# Altium integrated library WE-CMBNC Common Mode Power Line Choke.IntLib: 36 symbols
Pins are listed as number, name and electrical type; pins without a type are passive.

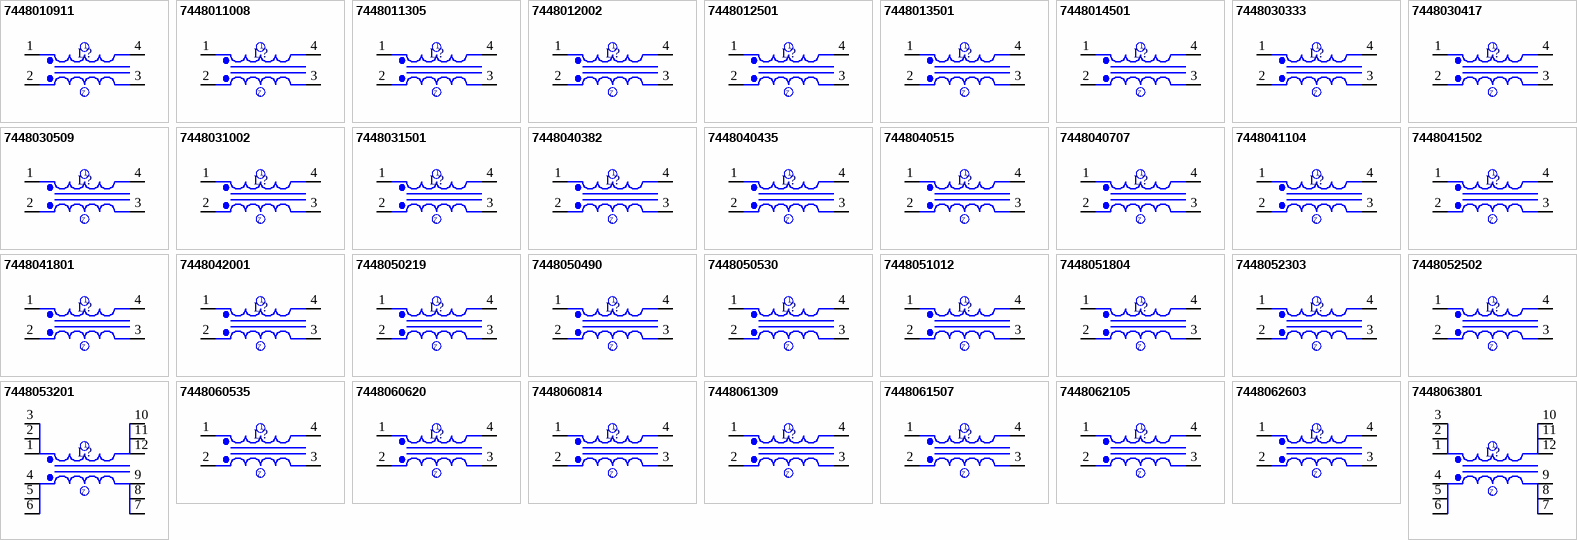
[diagram p0: symbols 7448010911 to 7448063801]

## 7448010911
designator L?
THT Common Mode Power Line  Choke, WE-CMBNC , L=2x11mH; PartNumber: 7448010911; Inductance: 2x11mH; PackageReference: Type XS-7448010911; ComponentLink1Description: Manufacturer URL; ComponentLink1URL: http://www.we-online.com; ComponentLink2Description: Datasheet; ComponentLink2URL: http://katalog.we-online.de/pbs/datasheet/7448042001.pdfhttp://katalog.we-online.de/pbs/datasheet/7448042001.pdfhttp://katalog.we-online.de/pbs/datasheet/7448042001.pdfhttp://katalog.we-online.de/pbs/datasheet/7448010911.pdf
footprint Type XS-7448010911 (THT-4pin- Body 14x7.5mm)
pins: 1, 2, 3, 4

## 7448011008
designator L?
THT Common Mode Power Line  Choke, WE-CMBNC , L=2x8mH; PartNumber: 7448011008; Inductance: 2x8mH; PackageReference: Type XS-7448011008; ComponentLink1Description: Manufacturer URL; ComponentLink1URL: http://www.we-online.com; ComponentLink2Description: Datasheet; ComponentLink2URL: http://katalog.we-online.de/pbs/datasheet/7448042001.pdfhttp://katalog.we-online.de/pbs/datasheet/7448042001.pdfhttp://katalog.we-online.de/pbs/datasheet/7448042001.pdfhttp://katalog.we-online.de/pbs/datasheet/7448011008.pdf
footprint Type XS-7448011008 (THT-4pin- Body 14x7.5mm)
pins: 1, 2, 3, 4

## 7448011305
designator L?
THT Common Mode Power Line  Choke, WE-CMBNC , L=2x5mH; PartNumber: 7448011305; Inductance: 2x5mH; PackageReference: Type XS-7448011305; ComponentLink1Description: Manufacturer URL; ComponentLink1URL: http://www.we-online.com; ComponentLink2Description: Datasheet; ComponentLink2URL: http://katalog.we-online.de/pbs/datasheet/7448042001.pdfhttp://katalog.we-online.de/pbs/datasheet/7448042001.pdfhttp://katalog.we-online.de/pbs/datasheet/7448042001.pdfhttp://katalog.we-online.de/pbs/datasheet/7448011305.pdf
footprint Type XS-7448011305 (THT-4pin- Body 14x7.5mm)
pins: 1, 2, 3, 4

## 7448012002
designator L?
THT Common Mode Power Line  Choke WE-CMBNC , L=2x1.6mH; PartNumber: 7448012002; PackageReference: Type XS-7448012002; Inductance: 2x1.6mH; ComponentLink1Description: Manufacturer URL; ComponentLink1URL: http://www.we-online.com; ComponentLink2Description: Datasheet; ComponentLink2URL: http://katalog.we-online.de/pbs/datasheet/7448042001.pdfhttp://katalog.we-online.de/pbs/datasheet/7448042001.pdfhttp://katalog.we-online.de/pbs/datasheet/7448042001.pdfhttp://katalog.we-online.de/pbs/datasheet/7448012002.pdf
footprint Type XS-7448012002 (THT-4pin- Body 14x7.5mm)
pins: 1, 2, 3, 4

## 7448012501
designator L?
THT Common Mode Power Line  Choke WE-CMBNC , L=2x1mH; PartNumber: 7448012501; Inductance: 2x1mH; PackageReference: Type XS-7448012501; ComponentLink1Description: Manufacturer URL; ComponentLink1URL: http://www.we-online.com; ComponentLink2Description: Datasheet; ComponentLink2URL: http://katalog.we-online.de/pbs/datasheet/7448042001.pdfhttp://katalog.we-online.de/pbs/datasheet/7448042001.pdfhttp://katalog.we-online.de/pbs/datasheet/7448042001.pdfhttp://katalog.we-online.de/pbs/datasheet/7448012501.pdf
footprint Type XS-7448012501 (THT-4pin- Body 15x7.5mm)
pins: 1, 2, 3, 4

## 7448013501
designator L?
THT Common Mode Power Line  Choke , WE-CMBNC, L=2x0.5mH; PartNumber: 7448013501; PackageReference: Type XS-7448013501; Inductance: 2x0.5 mH; ComponentLink1Description: Manufacturer URL; ComponentLink1URL: http://www.we-online.com; ComponentLink2Description: Datasheet; ComponentLink2URL: http://katalog.we-online.de/pbs/datasheet/7448042001.pdfhttp://katalog.we-online.de/pbs/datasheet/7448042001.pdfhttp://katalog.we-online.de/pbs/datasheet/7448042001.pdfhttp://katalog.we-online.de/pbs/datasheet/7448013501.pdf
footprint Type XS-7448013501 (THT-4pin- Body 15x7.5mm)
pins: 1, 2, 3, 4

## 7448014501
designator L?
THT Common Mode Power Line  Choke WE-CMBNC , L=2x0.4mH; PartNumber: 7448014501; PackageReference: Type XS-7448014501; Inductance: 2x0.4 mH; ComponentLink1Description: Manufacturer URL; ComponentLink1URL: http://www.we-online.com; ComponentLink2Description: Datasheet; ComponentLink2URL: http://katalog.we-online.de/pbs/datasheet/7448042001.pdfhttp://katalog.we-online.de/pbs/datasheet/7448042001.pdfhttp://katalog.we-online.de/pbs/datasheet/7448042001.pdfhttp://katalog.we-online.de/pbs/datasheet/7448014501.pdf
footprint Type XS-7448014501 (THT-3pin- Body 14x7.5mm)
pins: 1, 2, 3, 4

## 7448030333
designator L?
THT Common Mode Power Line  Choke WE-CMBNC , L=2x33mH; PartNumber: 7448030333; Inductance: 2x33mH; PackageReference: TYPE M-7448030333; ComponentLink1Description: Manufacturer URL; ComponentLink1URL: http://www.we-online.com; ComponentLink2Description: Datasheet; ComponentLink2URL: http://katalog.we-online.de/pbs/datasheet/7448042001.pdfhttp://katalog.we-online.de/pbs/datasheet/7448042001.pdfhttp://katalog.we-online.de/pbs/datasheet/7448042001.pdfhttp://katalog.we-online.de/pbs/datasheet/7448030333.pdf
footprint TYPE M-7448030333 (THT-4pin- Body 22x13.5mm)
pins: 1, 2, 3, 4

## 7448030417
designator L?
THT Common Mode Power Line  Choke WE-CMBNC , L=2x17mH; PartNumber: 7448030417; Inductance: 2x17mH; PackageReference: TYPE M-7448030509; ComponentLink1Description: Manufacturer URL; ComponentLink1URL: http://www.we-online.com; ComponentLink2Description: Datasheet; ComponentLink2URL: http://katalog.we-online.de/pbs/datasheet/7448042001.pdfhttp://katalog.we-online.de/pbs/datasheet/7448042001.pdfhttp://katalog.we-online.de/pbs/datasheet/7448042001.pdfhttp://katalog.we-online.de/pbs/datasheet/7448030417.pdf
footprint TYPE M-7448030509 (THT-4pin- Body 22x13.5mm)
pins: 1, 2, 3, 4

## 7448030509
designator L?
THT Common Mode Power Line  Choke WE-CMBNC , L=2x9mH; PartNumber: 7448030509; Inductance: 2x9mH; PackageReference: TYPE M-7448030509; ComponentLink1Description: Manufacturer URL; ComponentLink1URL: http://www.we-online.com; ComponentLink2Description: Datasheet; ComponentLink2URL: http://katalog.we-online.de/pbs/datasheet/7448042001.pdfhttp://katalog.we-online.de/pbs/datasheet/7448042001.pdfhttp://katalog.we-online.de/pbs/datasheet/7448042001.pdfhttp://katalog.we-online.de/pbs/datasheet/7448030509.pdf
footprint TYPE M-7448030509 (THT-4pin- Body 22x13.5mm)
pins: 1, 2, 3, 4

## 7448031002
designator L?
THT Common Mode Power Line  Choke WE-CMBNC , L=2x2mH; PartNumber: 7448031002; Inductance: 2x2mH; PackageReference: Type M-7448031002; ComponentLink1Description: Manufacturer URL; ComponentLink1URL: http://www.we-online.com; ComponentLink2Description: Datasheet; ComponentLink2URL: http://katalog.we-online.de/pbs/datasheet/7448042001.pdfhttp://katalog.we-online.de/pbs/datasheet/7448042001.pdfhttp://katalog.we-online.de/pbs/datasheet/7448042001.pdfhttp://katalog.we-online.de/pbs/datasheet/7448031002.pdf
footprint Type M-7448031002 (THT-4pin- Body 23x17mm)
pins: 1, 2, 3, 4

## 7448031501
designator L?
THT Common Mode Power Line  Choke WE-CMBNC , L=2x1mH; PartNumber: 7448031501; Inductance: 2x1mH; PackageReference: Type M-7448031501; ComponentLink1Description: Manufacturer URL; ComponentLink1URL: http://www.we-online.com; ComponentLink2Description: Datasheet; ComponentLink2URL: http://katalog.we-online.de/pbs/datasheet/7448042001.pdfhttp://katalog.we-online.de/pbs/datasheet/7448042001.pdfhttp://katalog.we-online.de/pbs/datasheet/7448042001.pdfhttp://katalog.we-online.de/pbs/datasheet/7448031501.pdf
footprint Type M-7448031501 (THT-4pin- Body 23x17mm)
pins: 1, 2, 3, 4

## 7448040382
designator L?
THT Common Mode Power Line  Choke WE-CMBNC , L=2x82mH; PartNumber: 7448040382; Inductance: 2x82mH; PackageReference: TYPE L-7448040382; ComponentLink1Description: Manufacturer URL; ComponentLink1URL: http://www.we-online.com; ComponentLink2Description: Datasheet; ComponentLink2URL: http://katalog.we-online.de/pbs/datasheet/7448042001.pdfhttp://katalog.we-online.de/pbs/datasheet/7448042001.pdfhttp://katalog.we-online.de/pbs/datasheet/7448042001.pdfhttp://katalog.we-online.de/pbs/datasheet/7448040382.pdf
footprint TYPE L-7448040382 (THT-4pin- Body 28mmx19mm)
pins: 1, 2, 3, 4

## 7448040435
designator L?
THT Common Mode Power Line  Choke WE-CMBNC , L=2x35mH; PartNumber: 7448040435; Inductance: 2x35mH; PackageReference: TYPE L-7448040435; ComponentLink1Description: Manufacturer URL; ComponentLink1URL: http://www.we-online.com; ComponentLink2Description: Datasheet; ComponentLink2URL: http://katalog.we-online.de/pbs/datasheet/7448042001.pdfhttp://katalog.we-online.de/pbs/datasheet/7448042001.pdfhttp://katalog.we-online.de/pbs/datasheet/7448042001.pdfhttp://katalog.we-online.de/pbs/datasheet/7448040435.pdf
footprint TYPE L-7448040435 (THT-4pin- Body 28mmx19mm)
pins: 1, 2, 3, 4

## 7448040515
designator L?
THT Common Mode Power Line  Choke WE-CMBNC , L=2x15mH; PartNumber: 7448040515; Inductance: 2x15mH; PackageReference: TYPE L-7448040515; ComponentLink1Description: Manufacturer URL; ComponentLink1URL: http://www.we-online.com; ComponentLink2Description: Datasheet; ComponentLink2URL: http://katalog.we-online.de/pbs/datasheet/7448042001.pdfhttp://katalog.we-online.de/pbs/datasheet/7448042001.pdfhttp://katalog.we-online.de/pbs/datasheet/7448042001.pdfhttp://katalog.we-online.de/pbs/datasheet/7448040515.pdf
footprint TYPE L-7448040515 (THT-4pin- Body 28mmx19mm)
pins: 1, 2, 3, 4

## 7448040707
designator L?
THT Common Mode Power Line  Choke WE-CMBNC , L=2x7mH; PartNumber: 7448040707; Inductance: 2x7mH; PackageReference: TYPE L-7448040707; ComponentLink1Description: Manufacturer URL; ComponentLink1URL: http://www.we-online.com; ComponentLink2Description: Datasheet; ComponentLink2URL: http://katalog.we-online.de/pbs/datasheet/7448042001.pdfhttp://katalog.we-online.de/pbs/datasheet/7448042001.pdfhttp://katalog.we-online.de/pbs/datasheet/7448042001.pdfhttp://katalog.we-online.de/pbs/datasheet/7448040707.pdf
footprint TYPE L-7448040707 (THT-4pin- Body 28mmx19mm)
pins: 1, 2, 3, 4

## 7448041104
designator L?
THT Common Mode Power Line  Choke WE-CMBNC , L=2x4mH; PartNumber: 7448041104; Inductance: 2x4mH; PackageReference: TYPE L-7448041104; ComponentLink1Description: Manufacturer URL; ComponentLink1URL: http://www.we-online.com; ComponentLink2Description: Datasheet; ComponentLink2URL: http://katalog.we-online.de/pbs/datasheet/7448042001.pdfhttp://katalog.we-online.de/pbs/datasheet/7448042001.pdfhttp://katalog.we-online.de/pbs/datasheet/7448042001.pdfhttp://katalog.we-online.de/pbs/datasheet/7448041104.pdf
footprint TYPE L-7448041104 (THT-4pin- Body 28mmx19mm)
pins: 1, 2, 3, 4

## 7448041502
designator L?
THT Common Mode Power Line  Choke WE-CMBNC , L=2x2mH; PartNumber: 7448041502; Inductance: 2x2mH; PackageReference: TYPE L-7448041502; ComponentLink1Description: Manufacturer URL; ComponentLink1URL: http://www.we-online.com; ComponentLink2Description: Datasheet; ComponentLink2URL: http://katalog.we-online.de/pbs/datasheet/7448042001.pdfhttp://katalog.we-online.de/pbs/datasheet/7448042001.pdfhttp://katalog.we-online.de/pbs/datasheet/7448042001.pdfhttp://katalog.we-online.de/pbs/datasheet/7448041502.pdf
footprint TYPE L-7448041502 (THT-4pin- Body 30x19mm)
pins: 1, 2, 3, 4

## 7448041801
designator L?
THT Common Mode Power Line  Choke WE-CMBNC , L=2x1.5mH; PartNumber: 7448041801; PackageReference: TYPE L-7448041801; Inductance: 2x1.5mH; ComponentLink1Description: Manufacturer URL; ComponentLink1URL: http://www.we-online.com; ComponentLink2Description: Datasheet; ComponentLink2URL: http://katalog.we-online.de/pbs/datasheet/7448042001.pdfhttp://katalog.we-online.de/pbs/datasheet/7448042001.pdfhttp://katalog.we-online.de/pbs/datasheet/7448042001.pdfhttp://katalog.we-online.de/pbs/datasheet/7448041801.pdf
footprint TYPE L-7448041801 (THT-4pin- Body 30x19mm)
pins: 1, 2, 3, 4

## 7448042001
designator L?
THT Common Mode Power Line  Choke WE-CMBNC , L=2x1mH; PartNumber: 7448042001; Inductance: 2x1mH; PackageReference: TYPE L-7448042001; ComponentLink1Description: Manufacturer URL; ComponentLink1URL: http://www.we-online.com; ComponentLink2Description: Datasheet; ComponentLink2URL: http://katalog.we-online.de/pbs/datasheet/7448042001.pdfhttp://katalog.we-online.de/pbs/datasheet/7448042001.pdfhttp://katalog.we-online.de/pbs/datasheet/7448042001.pdfhttp://katalog.we-online.de/pbs/datasheet/7448042001.pdf
footprint TYPE L-7448042001 (THT-4pin- Body 30x19mm)
pins: 1, 2, 3, 4

## 7448050219
designator L?
THT Common Mode Power Line  Choke WE-CMBNC , L=2x190mH; PartNumber: 7448050219; PackageReference: TYPE XL-7448050219; Inductance: 2x190mH; ComponentLink1Description: Manufacturer URL; ComponentLink1URL: http://www.we-online.com; ComponentLink2Description: Datasheet; ComponentLink2URL: http://katalog.we-online.de/pbs/datasheet/7448042001.pdfhttp://katalog.we-online.de/pbs/datasheet/7448042001.pdfhttp://katalog.we-online.de/pbs/datasheet/7448042001.pdfhttp://katalog.we-online.de/pbs/datasheet/7448050219.pdf
footprint TYPE XL-7448050219 (THT-4pin- Body 33mmx19mm)
pins: 1, 2, 3, 4

## 7448050490
designator L?
THT Common Mode Power Line  Choke WE-CMBNC , L=2x90mH; PartNumber: 7448050490; Inductance: 2x90mH; PackageReference: TYPE XL-7448050490; ComponentLink1Description: Manufacturer URL; ComponentLink1URL: http://www.we-online.com; ComponentLink2Description: Datasheet; ComponentLink2URL: http://katalog.we-online.de/pbs/datasheet/7448042001.pdfhttp://katalog.we-online.de/pbs/datasheet/7448042001.pdfhttp://katalog.we-online.de/pbs/datasheet/7448042001.pdfhttp://katalog.we-online.de/pbs/datasheet/7448050490.pdf
footprint TYPE XL-7448050490 (THT-4pin- Body 33mmx19mm)
pins: 1, 2, 3, 4

## 7448050530
designator L?
THT Common Mode Power Line  Choke WE-CMBNC , L=2x30mH; PartNumber: 7448050530; Inductance: 2x30mH; PackageReference: TYPE XL-7448050530; ComponentLink1Description: Manufacturer URL; ComponentLink1URL: http://www.we-online.com; ComponentLink2Description: Datasheet; ComponentLink2URL: http://katalog.we-online.de/pbs/datasheet/7448042001.pdfhttp://katalog.we-online.de/pbs/datasheet/7448042001.pdfhttp://katalog.we-online.de/pbs/datasheet/7448042001.pdfhttp://katalog.we-online.de/pbs/datasheet/7448050530.pdf
footprint TYPE XL-7448050530 (THT-4pin- Body 33mmx23mm)
pins: 1, 2, 3, 4

## 7448051012
designator L?
THT Common Mode Power Line  Choke WE-CMBNC , L=2x12mH; PartNumber: 7448051012; Inductance: 2x12mH; PackageReference: TYPE XL-7448051012; ComponentLink1Description: Manufacturer URL; ComponentLink1URL: http://www.we-online.com; ComponentLink2Description: Datasheet; ComponentLink2URL: http://katalog.we-online.de/pbs/datasheet/7448042001.pdfhttp://katalog.we-online.de/pbs/datasheet/7448042001.pdfhttp://katalog.we-online.de/pbs/datasheet/7448042001.pdfhttp://katalog.we-online.de/pbs/datasheet/7448051012.pdf
footprint TYPE XL-7448051012 (THT-4pin- Body 34mmx23mm)
pins: 1, 2, 3, 4

## 7448051804
designator L?
THT Common Mode Power Line  Choke WE-CMBNC , L=2x4.5mH; PartNumber: 7448051804; Note: TYPE XL-7448051804; PackageReference: TYPE L-7448042001; Inductance: 2x4.5mH; ComponentLink1Description: Manufacturer URL; ComponentLink1URL: http://www.we-online.com; ComponentLink2Description: Datasheet; ComponentLink2URL: http://katalog.we-online.de/pbs/datasheet/7448042001.pdfhttp://katalog.we-online.de/pbs/datasheet/7448042001.pdfhttp://katalog.we-online.de/pbs/datasheet/7448042001.pdfhttp://katalog.we-online.de/pbs/datasheet/7448051804.pdf
footprint TYPE L-7448042001 (THT-4pin- Body 30x19mm)
pins: 1, 2, 3, 4

## 7448052303
designator L?
THT Common Mode Power Line  Choke WE-CMBNC , L=2x3mH; PartNumber: 7448052303; Inductance: 2x3mH; PackageReference: TYPE XL-7448052303; ComponentLink1Description: Manufacturer URL; ComponentLink1URL: http://www.we-online.com; ComponentLink2Description: Datasheet; ComponentLink2URL: http://katalog.we-online.de/pbs/datasheet/7448042001.pdfhttp://katalog.we-online.de/pbs/datasheet/7448042001.pdfhttp://katalog.we-online.de/pbs/datasheet/7448042001.pdfhttp://katalog.we-online.de/pbs/datasheet/7448052303.pdf
footprint TYPE XL-7448052303 (THT-4pin- Body 36mmx23mm)
pins: 1, 2, 3, 4

## 7448052502
designator L?
THT Common Mode Power Line  Choke WE-CMBNC , L=2x2.5mH; PartNumber: 7448052502; PackageReference: TYPE XL-7448052502; Inductance: 2x2.5mH; ComponentLink1Description: Manufacturer URL; ComponentLink1URL: http://www.we-online.com; ComponentLink2Description: Datasheet; ComponentLink2URL: http://katalog.we-online.de/pbs/datasheet/7448042001.pdfhttp://katalog.we-online.de/pbs/datasheet/7448042001.pdfhttp://katalog.we-online.de/pbs/datasheet/7448042001.pdfhttp://katalog.we-online.de/pbs/datasheet/7448052502.pdf
footprint TYPE XL-7448052502 (THT-4pin- Body 36mmx23mm)
pins: 1, 2, 3, 4

## 7448053201
designator L?
THT Common Mode Power Line  Choke WE-CMBNC , L=2x0.9mH; PartNumber: 7448053201; PackageReference: TYPE XL-7448053201; Inductance: 2x0.9mH; ComponentLink1Description: Manufacturer URL; ComponentLink1URL: http://www.we-online.com; ComponentLink2Description: Datasheet; ComponentLink2URL: http://katalog.we-online.de/pbs/datasheet/7448042001.pdfhttp://katalog.we-online.de/pbs/datasheet/7448042001.pdfhttp://katalog.we-online.de/pbs/datasheet/7448042001.pdfhttp://katalog.we-online.de/pbs/datasheet/7448053201.pdf
footprint TYPE XL-7448053201 (THT-12pin- Body 37mmx23mm)
pins: 1, 2, 3, 4, 5, 6, 7, 8, 9, 10, 11, 12

## 7448060535
designator L?
THT Common Mode Power Line  Choke WE-CMBNC , L=2x35mH; PartNumber: 7448060535; Inductance: 2x35mH; PackageReference: TYPE XXL-7448060535; ComponentLink1Description: Manufacturer URL; ComponentLink1URL: http://www.we-online.com; ComponentLink2Description: Datasheet; ComponentLink2URL: http://katalog.we-online.de/pbs/datasheet/7448042001.pdfhttp://katalog.we-online.de/pbs/datasheet/7448042001.pdfhttp://katalog.we-online.de/pbs/datasheet/7448042001.pdfhttp://katalog.we-online.de/pbs/datasheet/7448060535.pdf
footprint TYPE XXL-7448060535 (THT-4pin- Body 42mmx27mm)
pins: 1, 2, 3, 4

## 7448060620
designator L?
THT Common Mode Power Line  Choke WE-CMBNC , L=2x20mH; PartNumber: 7448060620; Inductance: 2x20mH; PackageReference: TYPE XXL-7448060620; ComponentLink1Description: Manufacturer URL; ComponentLink1URL: http://www.we-online.com; ComponentLink2Description: Datasheet; ComponentLink2URL: http://katalog.we-online.de/pbs/datasheet/7448042001.pdfhttp://katalog.we-online.de/pbs/datasheet/7448042001.pdfhttp://katalog.we-online.de/pbs/datasheet/7448042001.pdfhttp://katalog.we-online.de/pbs/datasheet/7448060620.pdf
footprint TYPE XXL-7448060620 (THT-4pin- Body 42mmx27mm)
pins: 1, 2, 3, 4

## 7448060814
designator L?
THT Common Mode Power Line  Choke WE-CMBNC , L=2x14mH; PartNumber: 7448060814; Inductance: 2x14mH; PackageReference: TYPE XXL-7448060814; ComponentLink1Description: Manufacturer URL; ComponentLink1URL: http://www.we-online.com; ComponentLink2Description: Datasheet; ComponentLink2URL: http://katalog.we-online.de/pbs/datasheet/7448042001.pdfhttp://katalog.we-online.de/pbs/datasheet/7448042001.pdfhttp://katalog.we-online.de/pbs/datasheet/7448042001.pdfhttp://katalog.we-online.de/pbs/datasheet/7448060814.pdf
footprint TYPE XXL-7448060814 (THT-4pin- Body 43mmx27mm)
pins: 1, 2, 3, 4

## 7448061309
designator L?
THT Common Mode Power Line  Choke WE-CMBNC , L=2x9mH; PartNumber: 7448061309; Inductance: 2x9mH; PackageReference: TYPE XXL-7448061309; ComponentLink1Description: Manufacturer URL; ComponentLink1URL: http://www.we-online.com; ComponentLink2Description: Datasheet; ComponentLink2URL: http://katalog.we-online.de/pbs/datasheet/7448042001.pdfhttp://katalog.we-online.de/pbs/datasheet/7448042001.pdfhttp://katalog.we-online.de/pbs/datasheet/7448042001.pdfhttp://katalog.we-online.de/pbs/datasheet/7448061309.pdf
footprint TYPE XXL-7448061309 (THT-4pin- Body 44mmx27mm)
pins: 1, 2, 3, 4

## 7448061507
designator L?
THT Common Mode Power Line  Choke WE-CMBNC , L=2x7mH; PartNumber: 7448061507; Inductance: 2x7mH; PackageReference: TYPE XXL-7448061507; ComponentLink1Description: Manufacturer URL; ComponentLink1URL: http://www.we-online.com; ComponentLink2Description: Datasheet; ComponentLink2URL: http://katalog.we-online.de/pbs/datasheet/7448042001.pdfhttp://katalog.we-online.de/pbs/datasheet/7448042001.pdfhttp://katalog.we-online.de/pbs/datasheet/7448042001.pdfhttp://katalog.we-online.de/pbs/datasheet/7448061507.pdf
footprint TYPE XXL-7448061507 (THT-4pin- Body 46mmx27mm)
pins: 1, 2, 3, 4

## 7448062105
designator L?
THT Common Mode Power Line  Choke WE-CMBNC , L=2x5mH; PartNumber: 7448062105; Inductance: 2x5mH; PackageReference: TYPE XXL-7448062105; ComponentLink1Description: Manufacturer URL; ComponentLink1URL: http://www.we-online.com; ComponentLink2Description: Datasheet; ComponentLink2URL: http://katalog.we-online.de/pbs/datasheet/7448042001.pdfhttp://katalog.we-online.de/pbs/datasheet/7448042001.pdfhttp://katalog.we-online.de/pbs/datasheet/7448042001.pdfhttp://katalog.we-online.de/pbs/datasheet/7448062105.pdf
footprint TYPE XXL-7448062105 (THT-4pin- Body 46mmx27mm)
pins: 1, 2, 3, 4

## 7448062603
designator L?
THT Common Mode Power Line  Choke WE-CMBNC , L=2x3mH; PartNumber: 7448062603; Inductance: 2x3mH; PackageReference: TYPE XXL-7448062603; ComponentLink1Description: Manufacturer URL; ComponentLink1URL: http://www.we-online.com; ComponentLink2Description: Datasheet; ComponentLink2URL: http://katalog.we-online.de/pbs/datasheet/7448042001.pdfhttp://katalog.we-online.de/pbs/datasheet/7448042001.pdfhttp://katalog.we-online.de/pbs/datasheet/7448042001.pdfhttp://katalog.we-online.de/pbs/datasheet/7448062603.pdf
footprint TYPE XXL-7448062603 (THT-4pin- Body 47mmx27mm)
pins: 1, 2, 3, 4

## 7448063801
designator L?
THT Common Mode Power Line  Choke WE-CMBNC , L=2x1.5mH; PartNumber: 7448063801; PackageReference: TYPE XXL-7448063801; Inductance: 2x1.5mH; ComponentLink1Description: Manufacturer URL; ComponentLink1URL: http://www.we-online.com; ComponentLink2Description: Datasheet; ComponentLink2URL: http://katalog.we-online.de/pbs/datasheet/7448042001.pdfhttp://katalog.we-online.de/pbs/datasheet/7448042001.pdfhttp://katalog.we-online.de/pbs/datasheet/7448042001.pdfhttp://katalog.we-online.de/pbs/datasheet/7448063801.pdf
footprint TYPE XXL-7448063801 (THT-12pin- Body 48mmx27mm)
pins: 1, 2, 3, 4, 5, 6, 7, 8, 9, 10, 11, 12